# Altium footprint library PCBLib Matias.PcbLib: 46 footprints (part 2 of 3)
Each footprint in its own frame and in the unit in brackets; x right, y up, seen from the top. Pads: shape width x height; smd on the part's side, far side on the other; paste and mask are expansions set on the pad; w line width, h text height; cw(c..) or ccw(c..) is an arc to the next point about the centre after c.
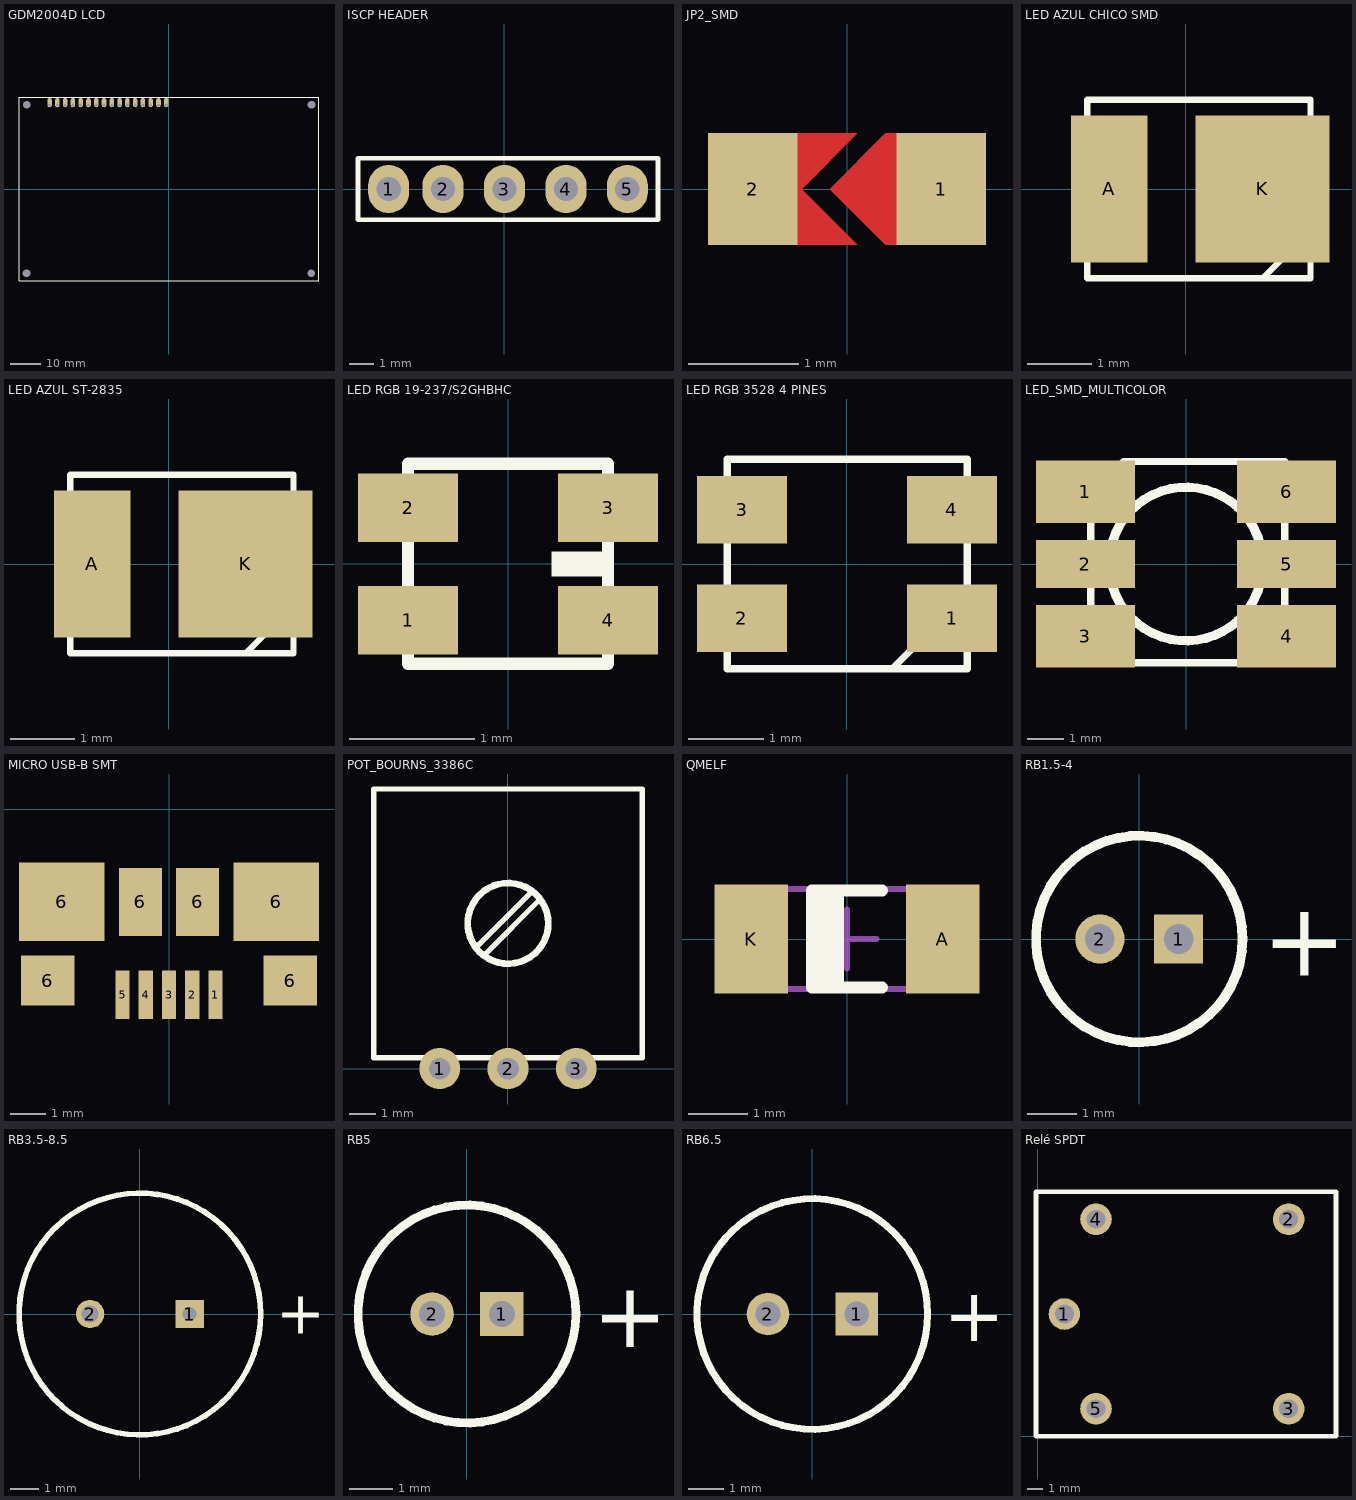
[diagram p1: the footprints below, top view; thin cyan lines are the x and y axes]

## GDM2004D LCD [mm]
pads (20):
  oval 1.5x3 hole 1 copper offset 0,0.7: 1(-39,27.5) 2(-36.46,27.5) 3(-33.92,27.5) 4(-31.38,27.5) 5(-28.84,27.5) 6(-26.3,27.5) 7(-23.76,27.5) 8(-21.22,27.5) 9(-18.68,27.5) 10(-16.14,27.5) 11(-13.6,27.5) 12(-11.06,27.5) 13(-8.52,27.5) 14(-5.98,27.5) 15(-3.44,27.5) 16(-0.9,27.5)
  round 1.524 hole 2.5: 5(-46.55,-27.5) 5(46.55,27.5) 6(-46.45,27.5) 6(46.45,-27.5)
Top Overlay:
  lines w0.2: -49,-30 -49,30 49,30 49,-30 -49,-30
3D body "LCD.stp": height 10.9, standoff 0, extent -49,-30 49,30

## ISCP HEADER [mm]
pads (5):
  oval 1.7x2 hole 1: 1(-4.79,0) 2(-2.54,0) 3(0,0) 4(2.54,0) 5(5.08,0)
Top Overlay:
  lines w0.2: -6.06,-1.27 6.35,-1.27 6.35,1.27 -6.06,1.27 -6.06,-1.27
3D body "Pines 5 macho.step": height 1.4, standoff -25.64, extent -6.25,-1.3 6.25,1.2

## JP2_SMD [mil]
height 78.74
pads (2):
  rect 32x40 smd: 1(33.75,0) 2(-33.75,0)
Top Layer:
  region: 23.75,20 13.75,20 -6.25,0 13.75,-20 23.75,-20
  region: -26.25,0 -16.25,0 3.75,20 -26.25,20
  region: -26.25,0 -16.25,0 3.75,-20 -26.25,-20
Top Paste:
  region: 23.75,20 13.75,20 -6.25,0 13.75,-20 23.75,-20
  region: -26.25,0 -16.25,0 3.75,20 -26.25,20
  region: -26.25,0 -16.25,0 3.75,-20 -26.25,-20
Top Solder:
  region: 23.75,24 13.75,24 -10.25,0 13.75,-24 23.75,-24
  region: -26.25,0 -12.25,0 11.75,24 -26.25,24
  region: -26.25,0 -12.25,0 11.75,-24 -26.25,-24

## LED AZUL CHICO SMD [mm]
pads (2):
  rect 1.2x2.3 smd: A(-1.2,0)
  rect 2.1x2.3 smd: K(1.2,0)
Top Overlay:
  lines w0.1: 1.2,-1.4 1.95,-0.65 1.95,-0.6 ; -1.55,-1.4 1.95,-1.4 1.95,1.4 -1.55,1.4 -1.55,-1.4
3D body "User Library-VSMY3850_PLCC-2.STEP": height 1.65, standoff 0, extent -1.549,-1.4 1.949,1.4

## LED AZUL ST-2835 [mm]
pads (2):
  rect 1.2x2.3 smd: A(-1.2,0)
  rect 2.1x2.3 smd: K(1.2,0)
Top Overlay:
  lines w0.1: 1.2,-1.4 1.95,-0.65 1.95,-0.6 ; -1.55,-1.4 -1.55,1.4 1.95,1.4 1.95,-1.4 -1.55,-1.4
3D body "User Library-VSMY3850_PLCC-2.STEP": height 1.65, standoff 0, extent -1.549,-1.4 1.949,1.4

## LED RGB 19-237/S2GHBHC [mm]
pads (4):
  rect 0.8x0.55 smd mask+0.05: 1(-0.8,-0.45) 2(-0.8,0.45) 3(0.8,0.45) 4(0.8,-0.45)
Top Overlay:
  rectangle: 0.35,-0.1 0.8,0.1
  lines w0.1: -0.8,-0.8 -0.8,0.8 0.8,0.8 0.8,-0.8 -0.8,-0.8
3D body "LED_RGB-ltst-c19he1wt-1.step": height 0.35, standoff -0.01, extent -0.8,-0.8 0.8,0.8

## LED RGB 3528 4 PINES [mm]
pads (4):
  rect 1.2x0.9 smd: 1(1.4,-0.725) 2(-1.4,-0.725) 3(-1.4,0.725) 4(1.4,0.725)
Top Overlay:
  lines w0.1: 0.6,-1.4 1.6,-0.4 ; 1.6,0 1.6,0.1 ; -1.6,-1.4 -1.6,1.4 1.6,1.4 1.6,-1.4 -1.6,-1.4
3D body "User Library-KAA-3528.step": height 1.9, standoff 0, extent -1.75,-1.4 1.75,1.4

## LED_SMD_MULTICOLOR [mm]
pads (6):
  rect 2.7x1.7 smd: 1(-2.75,1.975) 3(-2.75,-1.975) 4(2.75,-1.975) 6(2.75,1.975)
  rect 2.7x1.3 smd: 2(-2.75,0) 5(2.75,0)
Top Overlay:
  circle w0.254: c0,0 r2.1
  lines w0.2: -2.6,-2.7 2.7,-2.7 2.7,2.8 -1.7,2.8 -2.6,1.9 -2.6,-2.7
3D body "User Library-OF-SMD5060RGB.step": height 2, standoff 0, extent -2.6,-2.4 2.8,2.6

## MICRO USB-B SMT [mm]
pads (11):
  rect 0.4x1.35 smd mask+0.05: 1(1.3,-5.2)
  rect 0.4x1.35 smd paste+0 mask+0.05: 2(0.65,-5.2) 3(0,-5.2) 4(-0.65,-5.2) 5(-1.3,-5.2)
  rect 1.5x1.4 smd: 6(-3.4,-4.8) 6(3.4,-4.8)
  rect 2.4x2.2 smd: 6(-3,-2.6) 6(3,-2.6)
  rect 1.2x1.9 smd: 6(-0.8,-2.6) 6(0.8,-2.6)
3D body: height 0.25, standoff 0, extent -1.5,-4.463 -1.5,-4.463
3D body "User Library-micro usb SMD.step": height 2.63, standoff -0.07, extent -3.9,-5 3.9,0

## POT_BOURNS_3386C [mil]
pads (3):
  round 60 hole 31.5: 1(-100,0) 2(0,0) 3(100,0)
Top Overlay:
  circle w10: c0,212.6 r59.06
  lines w7.87: -46.26,178.15 33.46,257.87 ; -33.46,167.32 47.24,248.03 ; -196.85,15.75 196.85,15.75 196.85,409.45 -196.85,409.45 -196.85,15.75

## QMELF [mm] "MELF Diode, 2-Leads, Body 3,50x1,65mm, IPC Medium Density"
height 1.7
pads (2):
  rect 1.25x1.85 smd: A(1.625,0) K(-1.625,0)
Top Overlay:
  rectangle: -0.6,-0.825 -0.05,0.825
  lines w0.2: 0.6,-0.825 -0.6,-0.825 -0.6,0.825 0.6,0.825
Mechanical 1:
  lines w0.1: -0.5,0 0.5,0 ; 0,-0.5 0,0.5 ; -1.85,-0.85 1.85,-0.85 1.85,0.85 -1.85,0.85 -1.85,-0.85
3D body "User Library-Diode MELF.step": height 1.52, standoff 0.02, extent -1.75,-0.75 1.75,0.75

## RB1.5-4 [mm]
pads (2):
  rect 1x1 hole 0.6: 1(0.8,0)
  round 1 hole 0.6: 2(-0.8,0)
Top Overlay:
  circle w0.2: c0,0 r2.1
  text "+" at 2.5,-0.75 h1.5
3D body "User Library-Cap-EL(4x6-1_5)T.step": height 6.3, standoff -3.3, extent -2.002,-2 2,1.997

## RB3.5-8.5 [mm]
pads (2):
  rect 1x1 hole 0.5: 1(1.75,0)
  round 1 hole 0.6: 2(-1.75,0)
Top Overlay:
  circle w0.2: c0,0 r4.25
  text "+" at 4.8,-0.7 h1.5

## RB5 [mm]
pads (2):
  rect 1x1 hole 0.6: 1(0.8,0)
  round 1 hole 0.6: 2(-0.8,0)
Top Overlay:
  circle w0.2: c0,0 r2.5
  text "+" at 2.883,-0.762 h1.5

## RB6.5 [mm]
pads (2):
  rect 1.2x1.2 hole 0.7: 1(1.25,0)
  round 1.2 hole 0.7: 2(-1.25,0)
Top Overlay:
  circle w0.2: c0,0 r3.25
  text "+" at 3.703,-0.762 h1.5
3D body "User Library-CAPAER_D063_L115_P025_W005X030.STEP": height 11.51, standoff -3, extent -3.16,-3.15 3.15,3.15

## Relé SPDT [mm]
pads (5):
  round 2 hole 1.2: 1(1.7,7.75) 2(15.9,13.75) 3(15.9,1.75) 4(3.7,13.75) 5(3.7,1.75)
Top Overlay:
  lines w0.3: -0.1,0 -0.1,15.5 18.9,15.5 18.9,0 -0.1,0
3D body "Rele 2.stp": height 15.8, standoff -3.3, extent 0.3,-0.2 20.1,15.6